# Altium footprint library 2.52-直插元件.PcbLib: 467 footprints (part 8 of 30)
Each footprint in its own frame and in the unit in brackets; x right, y up, seen from the top. Pads: shape width x height; smd on the part's side, far side on the other; paste and mask are expansions set on the pad; w line width, h text height; cw(c..) or ccw(c..) is an arc to the next point about the centre after c.
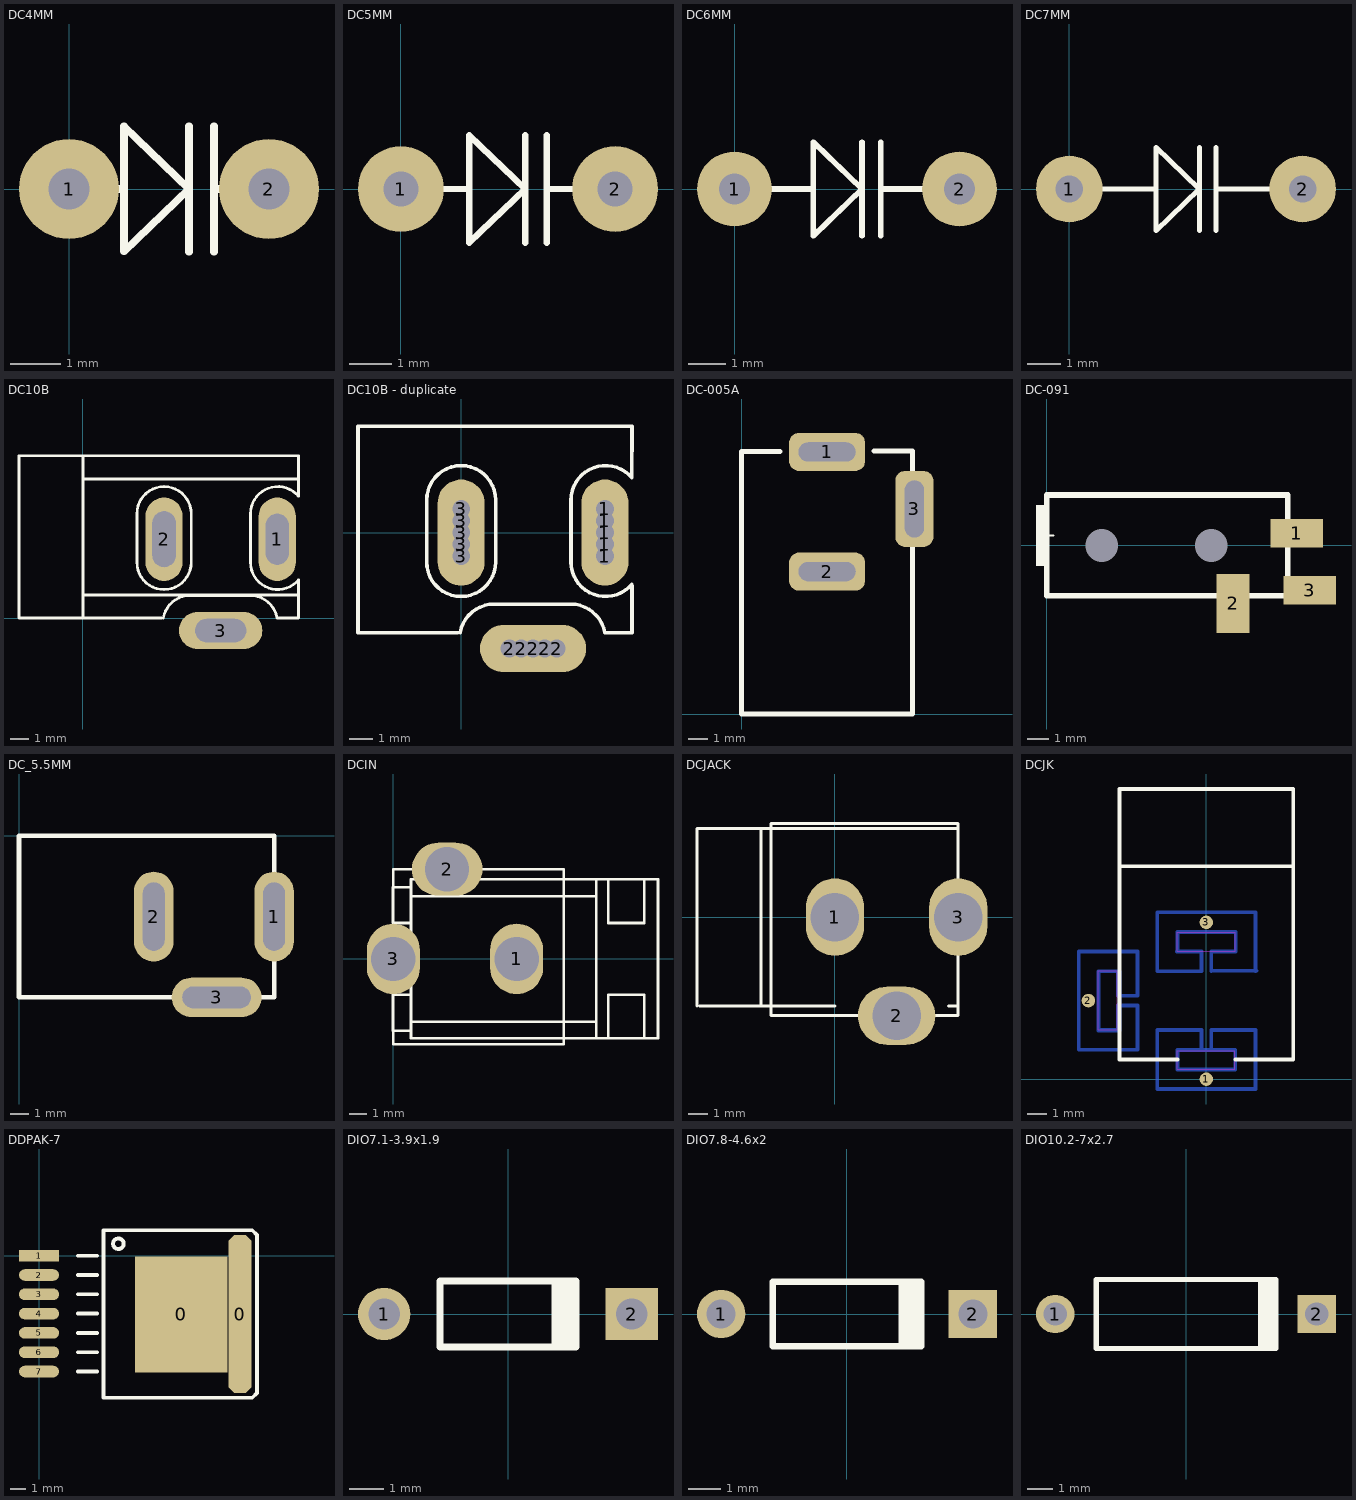
[diagram p7: the footprints below, top view; thin cyan lines are the x and y axes]

## DC4MM [mm]
pads (2):
  round 2 hole 0.82: 1(0,0) 2(4,0)
Top Overlay:
  lines w0.15: 0,0 1.1,0 ; 2.4,-1.25 2.4,1.25 ; 2.9,-1.25 2.9,1.25 ; 2.9,0 4,0 ; 1.1,-1.25 1.1,1.25 2.4,0 1.1,-1.25

## DC5MM [mm]
pads (2):
  round 2 hole 0.82: 1(0,0) 2(5,0)
Top Overlay:
  lines w0.15: 0,0 1.6,0 ; 2.9,-1.25 2.9,1.25 ; 3.4,-1.25 3.4,1.25 ; 3.4,0 5,0 ; 1.6,-1.25 1.6,1.25 2.9,0 1.6,-1.25

## DC6MM [mm]
pads (2):
  round 2 hole 0.82: 1(0,0) 2(6,0)
Top Overlay:
  lines w0.15: 0,0 2.1,0 ; 3.4,-1.25 3.4,1.25 ; 3.9,-1.25 3.9,1.25 ; 3.9,0 6,0 ; 2.1,-1.25 2.1,1.25 3.4,0 2.1,-1.25

## DC7MM [mm]
pads (2):
  round 2 hole 0.82: 1(0,0) 2(7,0)
Top Overlay:
  lines w0.15: 0,0 2.6,0 ; 3.9,-1.25 3.9,1.25 ; 4.4,-1.25 4.4,1.25 ; 4.4,0 7,0 ; 2.6,-1.25 2.6,1.25 3.9,0 2.6,-1.25

## DC10B [mil]
pads (3):
  oval 80x180 hole 50 slot 110 at 90 deg: 1(419.09,170)
  oval 80x180 hole 50 slot 120 at 90 deg: 2(175,170)
  oval 180x80 hole 50 slot 110 at 0 deg: 3(297.05,-26.85)
Top Overlay:
  lines w6: 0,50 465,50 ; 0,300 460.13,300 464.25,300 ; 5,350 -15,350 -137.8,350 -137.8,0 0,0 ; 169,0 0,0 ; 173.37,0.16 cw(c231,-10) 231,48.52 361,48.52 cw(c361,-10) 418.63,0.16 ; 420,0 465,0 465,80 ; 464.83,82.38 cw(c420,120) 361.48,120 361.48,225 cw(c420,225) 464.83,262.62 465,350 0,350 0,0 ; 233.52,225 ccw(c175,225) 116.48,225 116.48,120 ccw(c175,120) 233.52,120 233.52,225 ; 233.52,225 233.52,225

## DC10B - duplicate [mil]
pads (15):
  round 45 hole 30: 1(244.09,-40) 1(244.09,-20) 1(244.09,20) 1(244.09,40) 2(82.05,-196.85) 2(102.05,-196.85) 2(142.05,-196.85) 2(162.05,-196.85) 3(0,-40) 3(0,-20) 3(0,20) 3(0,40)
  oval 80x180 hole 30: 1(244.09,0) 3(0,0)
  oval 180x80 hole 30: 2(122.05,-196.85)
Top Overlay:
  lines w6: -6,-170 -175,-170 -175,180 290,180 289.83,92.62 ccw(c245,55) 186.48,55 186.48,-50 ccw(c245,-50) 289.83,-87.62 ; -1.63,-169.84 cw(c56,-180) 56,-121.48 186,-121.48 cw(c186,-180) 243.63,-169.84 ; 245,-170 290,-170 290,-90 ; -58.52,55 cw(c0,55) 58.52,55 ; -58.52,55 -58.52,-50 ccw(c0,-50) 58.52,-50 58.52,55 ; -58.52,55 -58.52,55 ; 58.52,55 58.52,55

## DC-005A [mm]
pads (3):
  rrect50% 4x2 hole 1 slot 3 at 0 deg: 1(4.5,13.8) 2(4.5,7.5)
  rrect50% 2x4 hole 1 slot 3 at 90 deg: 3(9.1,10.8)
Top Overlay:
  lines w0.254: 2.018,13.818 0,13.818 0,0 9,0 9,8.8 ; 6.957,13.843 9,13.843 9,12.8
3D body "User Library-dc range - dc connector[4840_2201].STEP": height 11.02, standoff -3.48, extent -0.003,0.017 9.503,13.843

## DC-091 [mm]
pads (5):
  round 0 hole 1.5 mask+0: 0(2.5,0) 0(7.5,0)
  rect 2.4x1.3 smd: 1(11.4,0.55) 3(12,-2.05)
  rect 1.5x2.7 smd: 2(8.5,-2.65)
Top Overlay:
  rectangle: -0.5,-0.95 0.1,1.85
  lines w0.1: -0.2,0.45 0.3,0.45
  lines w0.254: 0,-2.3 0,2.3 11,2.3 11,-2.3 0,-2.3
3D body "DC.STEP": height 4.4, standoff -0.8, extent 0.025,-3.875 12.625,2.425

## DC_5.5MM [mm]
pads (3):
  oval 2.2x5 hole 1.2 slot 3.8 at 90 deg: 1(14.2,-4.5) 2(7.5,-4.5)
  oval 5x2.2 hole 1.2 slot 3.8 at 0 deg: 3(11,-9)
Top Overlay:
  lines w0.254: 0,-9 0,0 14.2,0 14.2,-9 0,-9
3D body "DC-3.5.STEP": height 10.82, standoff -4.18, extent -0.102,-8.876 14.098,-0.116

## DCIN [mm]
pads (3):
  oval 3x4 hole 2.5: 1(7,0) 3(0.015,0)
  oval 4x3 hole 2.5: 2(3.063,5.08)
Top Overlay:
  lines w0.15: 1.016,-4.064 0,-4.064 0,-2.032 1.016,-2.032 ; 1.016,-3.556 11.5,-3.556 ; 1.016,2.032 0,2.032 0,4.064 1.016,4.064 ; 1.016,3.556 11.5,3.556 ; 11.5,-4.5 11.5,4.5 ; 12.192,-4.5 12.192,-2.032 14.224,-2.032 14.224,-4.5 ; 12.192,4.5 12.192,2.032 14.224,2.032 14.224,4.5 ; 0.015,-4.826 0.015,5.08 9.667,5.08 9.667,-4.826 0.015,-4.826 ; 1.016,-4.5 15,-4.5 15,4.5 1.016,4.5 1.016,-4.5
Keep-Out Layer:
  lines w0.15: 0,-1.143 0,1.143 ; 1.905,4.572 4.191,4.572 ; 7,-1.143 7,1.143
3D body "User Library-CON-077.step": height 11.55, standoff -3.5, extent -0.075,-4.552 14.075,5.032

## DCJACK [mm]
pads (3):
  oval 3x4 hole 2.5: 1(0,0) 3(6.35,0)
  oval 4x3 hole 2.5: 2(3.175,-5.08)
Top Overlay:
  lines w0.15: -7.112,-4.572 -7.112,4.572 6.223,4.572 ; -6.985,-4.572 0,-4.572 ; -3.81,-4.572 -3.81,4.572 ; 5.842,-4.572 6.35,-4.572 6.35,-2.54 ; 6.35,2.54 6.35,4.572 ; -3.302,-5.08 -3.302,4.826 6.35,4.826 6.35,-5.08 -3.302,-5.08
3D body "User Library-CON-077.step": height 11, standoff -4.05, extent -7.353,-5.024 6.797,4.56

## DCJK [mm]
pads (3):
  round 0.7 all layers, no hole: 1(0,0) 2(-6.1,4.066) 3(0,8.116)
Bottom Layer:
  lines w0.2: -1.524,6.604 -0.254,6.604 -0.254,5.588 -2.54,5.588 -2.54,8.636 2.54,8.636 2.54,5.588 ; -1.5,1.016 -1.5,1.516 ; -1.5,6.604 -1.5,7.616 1.5,7.616 ; -0.254,1.524 -0.254,2.54 -2.54,2.54 -2.54,-0.508 2.54,-0.508 2.54,2.54 0.254,2.54 0.254,1.524 ; 0.254,5.588 0.254,6.604 1.524,6.604 1.524,7.62 ; 0.317,5.608 2.603,5.608 ; 1.5,1.016 1.5,1.516 ; -5.588,5.588 -4.5,5.588 -4.5,2.516 -5.588,2.516 -5.588,5.588 ; -5.588,5.588 -5.588,2.54 -4.572,2.54 -4.572,3.81 -3.556,3.81 -3.556,1.524 -6.604,1.524 -6.604,6.604 -3.556,6.604 -3.556,4.318 -4.572,4.318 -4.572,5.588 -5.588,5.588 ; -1.5,1.516 -1.5,0.508 1.5,0.508 1.5,1.516 ; -1.5,1.516 1.5,1.516
Top Overlay:
  lines w0.2: -4.5,11.016 4.5,11.016 ; -1.5,1.016 -4.5,1.016 -4.5,15.016 4.5,15.016 4.5,1.016 1.5,1.016
Keep-Out Layer:
  lines w0.05: -5.597,2.558 -5.597,5.608 -4.597,5.608 -4.597,2.558 -5.597,2.558 ; -1.497,0.508 1.478,0.508 1.478,1.483 -1.497,1.483 -1.497,0.508 ; -1.497,6.608 1.503,6.608 1.503,7.608 -1.497,7.608 -1.497,6.608

## DDPAK-7 [mil]
pads (9):
  rect 240x300 smd: 0(368,-152)
  oct 60x410 smd: 0(520,-151)
  rect 104x30 smd: 1(0,0)
  oval 104x30 smd: 2(0,-50) 3(0,-100) 4(0,-150) 5(0,-200) 6(0,-250) 7(0,-300)
Top Overlay:
  circle w10: c205.4,31 r13.6
  lines w10: 100,-300 150,-300 ; 100,-250 150,-250 ; 100,-200 150,-200 ; 100,-150 150,-150 ; 100,-100 150,-100 ; 100,-50 150,-50 ; 100,0 150,0 ; 167,-368 537,-368 552,-368 564,-356 564,54 552,66 537,66 167,66 167,-368

## DIO7.1-3.9x1.9 [mm] "Diode, Axial; Body 3.8 x 1.9 mm (LxDia. max), Lead Dia. 0.53 mm (max)"
height 1.9
pads (2):
  round 1.5 hole 0.9: 1(-3.55,0)
  rect 1.5x1.5 hole 0.9: 2(3.55,0)
Top Overlay:
  rectangle: 1.25,-0.95 2.05,0.95
  lines w0.2: 1.95,-0.95 -1.95,-0.95 -1.95,0.95 1.95,0.95

## DIO7.8-4.6x2 [mm] "Diode, Axial; Body 4.6 x 1.9 mm (LxDia. max), Lead Dia. 0.53 mm (max)"
height 2
pads (2):
  round 1.5 hole 0.9: 1(-3.9,0)
  rect 1.5x1.5 hole 0.9: 2(3.9,0)
Top Overlay:
  rectangle: 1.6,-1 2.4,1
  lines w0.2: 2.3,-1 -2.3,-1 -2.3,1 2.3,1

## DIO10.2-7x2.7 [mm] "Diode, Axial; Body 7 x 2.7 mm (LxDia. max), Lead Dia. 0.53 mm (max)"
height 2.7
pads (2):
  round 1.5 hole 0.9: 1(-5.1,0)
  rect 1.5x1.5 hole 0.9: 2(5.1,0)
Top Overlay:
  rectangle: 2.8,-1.35 3.6,1.35
  lines w0.2: 3.5,-1.35 -3.5,-1.35 -3.5,1.35 3.5,1.35